# Altium footprint library Reflow3D1411sep.PcbLib: 657 footprints (part 23 of 42)
Each footprint in its own frame and in the unit in brackets; x right, y up, seen from the top. Pads: shape width x height; smd on the part's side, far side on the other; paste and mask are expansions set on the pad; w line width, h text height; cw(c..) or ccw(c..) is an arc to the next point about the centre after c.
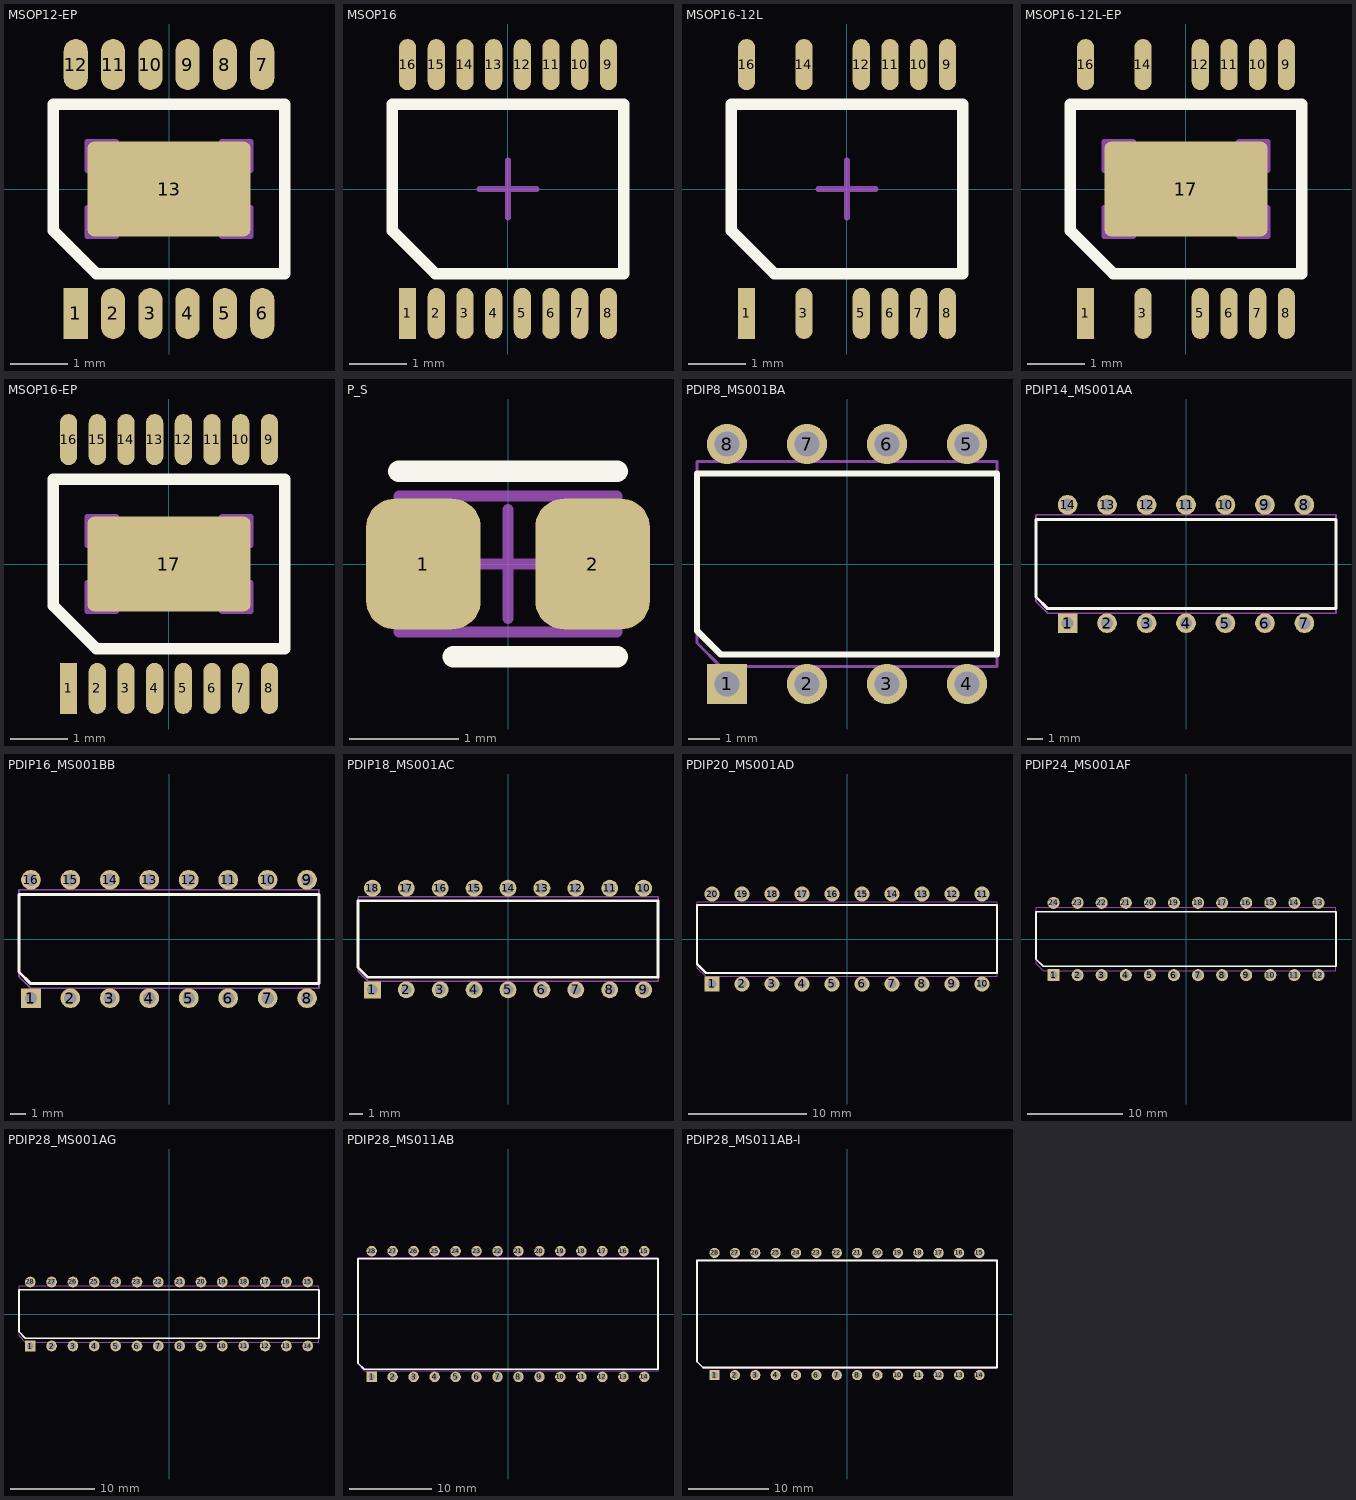
[diagram p22: the footprints below, top view; thin cyan lines are the x and y axes]

## MSOP12-EP [mm] "www.linear.com, MSE12.pdf"
height 0.96
pads (13):
  rect 0.42x0.89 smd mask+0.05: 1(-1.625,-2.17)
  oval 0.42x0.89 smd mask+0.05: 2(-0.975,-2.17) 3(-0.325,-2.17) 4(0.325,-2.17) 5(0.975,-2.17) 6(1.625,-2.17) 7(1.625,2.17) 8(0.975,2.17) 9(0.325,2.17) 10(-0.325,2.17) 11(-0.975,2.17) 12(-1.625,2.17)
  rrect15% 2.85x1.65 smd mask+0.075: 13(0,0)
Top Overlay:
  lines w0.2: -2.02,-0.725 -2.02,1.475 2.02,1.475 2.02,-1.475 -1.27,-1.475 -2.02,-0.725
Mechanical 13:
  lines w0.1: -1.425,-0.325 -1.425,-0.825 -0.925,-0.825 ; -1.425,0.325 -1.425,0.825 -0.925,0.825 ; 0.925,-0.825 1.425,-0.825 1.425,-0.325 ; 0.925,0.825 1.425,0.825 1.425,0.325 ; -2.02,-0.75 -2.02,1.5 2.02,1.5 2.02,-1.5 -1.27,-1.5 -2.02,-0.75
Mechanical 15:
  lines w0.1: -0.5,0 0.5,0 ; 0,-0.5 0,0.5
3D body: height 1.1, standoff 0, extent -2.07,-1.55 2.07,1.55

## MSOP16 [mm] "www.linear.com, MSOP_16_05-08-1669.pdf"
height 0.96
pads (16):
  rect 0.3x0.89 smd mask+0.05: 1(-1.75,-2.17)
  oval 0.3x0.89 smd mask+0.05: 2(-1.25,-2.17) 3(-0.75,-2.17) 4(-0.25,-2.17) 5(0.25,-2.17) 6(0.75,-2.17) 7(1.25,-2.17) 8(1.75,-2.17) 9(1.75,2.17) 10(1.25,2.17) 11(0.75,2.17) 12(0.25,2.17) 13(-0.25,2.17) 14(-0.75,2.17) 15(-1.25,2.17) 16(-1.75,2.17)
Top Overlay:
  lines w0.2: -2.02,-0.725 -2.02,1.475 2.02,1.475 2.02,-1.475 -1.27,-1.475 -2.02,-0.725
Mechanical 13:
  lines w0.1: -2.02,-0.75 -2.02,1.5 2.02,1.5 2.02,-1.5 -1.27,-1.5 -2.02,-0.75
Mechanical 15:
  lines w0.1: -0.5,0 0.5,0 ; 0,-0.5 0,0.5
3D body: height 1.1, standoff 0, extent -2.07,-1.55 2.07,1.55

## MSOP16-12L [mm] "www.linear.com, MSOP_16_12_05-08-1847.pdf"
height 0.96
pads (12):
  rect 0.3x0.89 smd mask+0.05: 1(-1.75,-2.17)
  oval 0.3x0.89 smd mask+0.05: 3(-0.75,-2.17) 5(0.25,-2.17) 6(0.75,-2.17) 7(1.25,-2.17) 8(1.75,-2.17) 9(1.75,2.17) 10(1.25,2.17) 11(0.75,2.17) 12(0.25,2.17) 14(-0.75,2.17) 16(-1.75,2.17)
Top Overlay:
  lines w0.2: -2.02,-0.725 -2.02,1.475 2.02,1.475 2.02,-1.475 -1.27,-1.475 -2.02,-0.725
Mechanical 13:
  lines w0.1: -2.02,-0.75 -2.02,1.5 2.02,1.5 2.02,-1.5 -1.27,-1.5 -2.02,-0.75
Mechanical 15:
  lines w0.1: -0.5,0 0.5,0 ; 0,-0.5 0,0.5
3D body: height 1.1, standoff 0, extent -2.07,-1.55 2.07,1.55

## MSOP16-12L-EP [mm] "www.linear.com, MSOP_16_05-08-1871.pdf"
height 0.96
pads (13):
  rect 0.3x0.89 smd mask+0.05: 1(-1.75,-2.17)
  oval 0.3x0.89 smd mask+0.05: 3(-0.75,-2.17) 5(0.25,-2.17) 6(0.75,-2.17) 7(1.25,-2.17) 8(1.75,-2.17) 9(1.75,2.17) 10(1.25,2.17) 11(0.75,2.17) 12(0.25,2.17) 14(-0.75,2.17) 16(-1.75,2.17)
  rrect15% 2.85x1.65 smd mask+0.075: 17(0,0)
Top Overlay:
  lines w0.2: -2.02,-0.725 -2.02,1.475 2.02,1.475 2.02,-1.475 -1.27,-1.475 -2.02,-0.725
Mechanical 13:
  lines w0.1: -1.425,-0.325 -1.425,-0.825 -0.925,-0.825 ; -1.425,0.325 -1.425,0.825 -0.925,0.825 ; 0.925,-0.825 1.425,-0.825 1.425,-0.325 ; 0.925,0.825 1.425,0.825 1.425,0.325 ; -2.02,-0.75 -2.02,1.5 2.02,1.5 2.02,-1.5 -1.27,-1.5 -2.02,-0.75
Mechanical 15:
  lines w0.1: -0.5,0 0.5,0 ; 0,-0.5 0,0.5
3D body: height 1.1, standoff 0, extent -2.07,-1.55 2.07,1.55

## MSOP16-EP [mm] "www.linear.com, MSOP_16_05-08-1667.pdf"
height 0.96
pads (17):
  rect 0.3x0.89 smd mask+0.05: 1(-1.75,-2.17)
  oval 0.3x0.89 smd mask+0.05: 2(-1.25,-2.17) 3(-0.75,-2.17) 4(-0.25,-2.17) 5(0.25,-2.17) 6(0.75,-2.17) 7(1.25,-2.17) 8(1.75,-2.17) 9(1.75,2.17) 10(1.25,2.17) 11(0.75,2.17) 12(0.25,2.17) 13(-0.25,2.17) 14(-0.75,2.17) 15(-1.25,2.17) 16(-1.75,2.17)
  rrect15% 2.85x1.65 smd mask+0.075: 17(0,0)
Top Overlay:
  lines w0.2: -2.02,-0.725 -2.02,1.475 2.02,1.475 2.02,-1.475 -1.27,-1.475 -2.02,-0.725
Mechanical 13:
  lines w0.1: -1.425,-0.325 -1.425,-0.825 -0.925,-0.825 ; -1.425,0.325 -1.425,0.825 -0.925,0.825 ; 0.925,-0.825 1.425,-0.825 1.425,-0.325 ; 0.925,0.825 1.425,0.825 1.425,0.325 ; -2.02,-0.75 -2.02,1.5 2.02,1.5 2.02,-1.5 -1.27,-1.5 -2.02,-0.75
Mechanical 15:
  lines w0.1: -0.5,0 0.5,0 ; 0,-0.5 0,0.5
3D body: height 1.1, standoff 0, extent -2.07,-1.55 2.07,1.55

## P_S [mm] "www.nec-tokin.com, capacitors.pdf; http://www.ncc-matsuo.co.jp, 278m.pdf"
height 1.1
pads (2):
  rrect50% 1.05x1.2 smd mask+0.075: 1(-0.775,0) 2(0.775,0)
Top Overlay:
  lines w0.2: -1,0.85 1,0.85 ; -0.5,-0.85 1,-0.85
Mechanical 13:
  lines w0.1: -0.5,-0.625 -0.5,0.625 ; -1,-0.625 1,-0.625 1,0.625 -1,0.625 -1,-0.625
Mechanical 15:
  lines w0.1: -0.5,0 0.5,0 ; 0,-0.5 0,0.5
3D body: height 1.2, standoff 0, extent -1.1,-0.725 1.1,0.725

## PCBComponent_1 [mm]

## PDIP8_MS001BA [mil] "www.ti.com, mpdi059.pdf, NTC8.asc"
height 150
pads (8):
  rect 50x50 hole 31: 1(-150,-150)
  round 50 hole 31: 2(-50,-150) 3(50,-150) 4(150,-150) 5(150,150) 6(50,150) 7(-50,150) 8(-150,150)
Top Overlay:
  lines w7.87: -187.6,-83.66 -187.6,113.19 187.6,113.19 187.6,-113.19 -158.07,-113.19 -187.6,-83.66
Mechanical 13:
  lines w3.94: -187.6,-98.82 -187.6,128.35 187.6,128.35 187.6,-128.35 -158.07,-128.35 -187.6,-98.82
3D body: height 164.96, standoff 0, extent -195.08,-137.6 195.08,137.6

## PDIP14_MS001AA [mil] "www.ti.com, mpdi002c.pdf, N14.asc"
height 167.72
pads (14):
  rect 50x50 hole 31: 1(-300,-150)
  round 50 hole 31: 2(-200,-150) 3(-100,-150) 4(0,-150) 5(100,-150) 6(200,-150) 7(300,-150) 8(300,150) 9(200,150) 10(100,150) 11(0,150) 12(-100,150) 13(-200,150) 14(-300,150)
Top Overlay:
  lines w7.87: -380.12,-83.66 -350.59,-113.19 380.12,-113.19 380.12,113.19 -380.12,113.19 -380.12,-83.66
Mechanical 13:
  lines w3.94: -380.12,-95.47 -350.59,-125 380.12,-125 380.12,125 -380.12,125 -380.12,-95.47
3D body: height 200, standoff 0, extent -387.6,-129.92 387.6,129.92

## PDIP16_MS001BB [mil] "www.ti.com, mpdi002c.pdf, N16.asc"
height 167.72
pads (16):
  rect 50x50 hole 31: 1(-350,-150)
  round 50 hole 31: 2(-250,-150) 3(-150,-150) 4(-50,-150) 5(50,-150) 6(150,-150) 7(250,-150) 8(350,-150) 9(350,150) 10(250,150) 11(150,150) 12(50,150) 13(-50,150) 14(-150,150) 15(-250,150) 16(-350,150)
Top Overlay:
  lines w7.87: -380.12,-83.66 -350.59,-113.19 380.12,-113.19 380.12,113.19 -380.12,113.19 -380.12,-83.66
Mechanical 13:
  lines w3.94: -380.12,-95.47 -350.59,-125 380.12,-125 380.12,125 -380.12,125 -380.12,-95.47
3D body: height 200, standoff 0, extent -387.6,-129.92 387.6,129.92

## PDIP18_MS001AC [mil] "www.ti.com, mpdi002c.pdf, N18.asc"
height 167.72
pads (18):
  rect 50x50 hole 31: 1(-400,-150)
  round 50 hole 31: 2(-300,-150) 3(-200,-150) 4(-100,-150) 5(0,-150) 6(100,-150) 7(200,-150) 8(300,-150) 9(400,-150) 10(400,150) 11(300,150) 12(200,150) 13(100,150) 14(0,150) 15(-100,150) 16(-200,150) 17(-300,150) 18(-400,150)
Top Overlay:
  lines w7.87: -442.52,-83.66 -412.99,-113.19 442.52,-113.19 442.52,113.19 -442.52,113.19 -442.52,-83.66
Mechanical 13:
  lines w3.94: -442.52,-95.47 -412.99,-125 442.52,-125 442.52,125 -442.52,125 -442.52,-95.47
3D body: height 200, standoff 0, extent -460.04,-129.92 460.04,129.92

## PDIP20_MS001AD [mil] "www.ti.com, mpdi002c.pdf, N20.asc"
height 167.72
pads (20):
  rect 50x50 hole 31: 1(-450,-150)
  round 50 hole 31: 2(-350,-150) 3(-250,-150) 4(-150,-150) 5(-50,-150) 6(50,-150) 7(150,-150) 8(250,-150) 9(350,-150) 10(450,-150) 11(450,150) 12(350,150) 13(250,150) 14(150,150) 15(50,150) 16(-50,150) 17(-150,150) 18(-250,150) 19(-350,150) 20(-450,150)
Top Overlay:
  lines w7.87: -500,-83.66 -470.47,-113.19 500,-113.19 500,113.19 -500,113.19 -500,-83.66
Mechanical 13:
  lines w3.94: -500,-95.47 -470.47,-125 500,-125 500,125 -500,125 -500,-95.47
3D body: height 200, standoff 0, extent -529.92,-129.92 529.92,129.92

## PDIP24_MS001AF [mil] "www.ti.com, mpdi004a.pdf, NT24.asc"
height 167.72
pads (24):
  rect 50x50 hole 31: 1(-550,-150)
  round 50 hole 31: 2(-450,-150) 3(-350,-150) 4(-250,-150) 5(-150,-150) 6(-50,-150) 7(50,-150) 8(150,-150) 9(250,-150) 10(350,-150) 11(450,-150) 12(550,-150) 13(550,150) 14(450,150) 15(350,150) 16(250,150) 17(150,150) 18(50,150) 19(-50,150) 20(-150,150) 21(-250,150) 22(-350,150) 23(-450,150) 24(-550,150)
Top Overlay:
  lines w7.87: -622.83,-83.66 -593.31,-113.19 622.83,-113.19 622.83,113.19 -622.83,113.19 -622.83,-83.66
Mechanical 13:
  lines w3.94: -622.83,-102.95 -593.31,-132.48 622.83,-132.48 622.83,132.48 -622.83,132.48 -622.83,-102.95
3D body: height 200, standoff 0, extent -630.71,-139.96 630.71,139.96

## PDIP28_MS001AG [mil] "www.ti.com, mpdi004a.pdf, NT28.asc"
height 167.72
pads (28):
  rect 50x50 hole 31: 1(-650,-150)
  round 50 hole 31: 2(-550,-150) 3(-450,-150) 4(-350,-150) 5(-250,-150) 6(-150,-150) 7(-50,-150) 8(50,-150) 9(150,-150) 10(250,-150) 11(350,-150) 12(450,-150) 13(550,-150) 14(650,-150) 15(650,150) 16(550,150) 17(450,150) 18(350,150) 19(250,150) 20(150,150) 21(50,150) 22(-50,150) 23(-150,150) 24(-250,150) 25(-350,150) 26(-450,150) 27(-550,150) 28(-650,150)
Top Overlay:
  lines w7.87: -702.56,-83.66 -702.56,113.19 702.56,113.19 702.56,-113.19 -673.03,-113.19 -702.56,-83.66
Mechanical 13:
  lines w3.94: -702.56,-102.95 -702.56,132.48 702.56,132.48 702.56,-132.48 -673.03,-132.48 -702.56,-102.95
3D body: height 200, standoff 0, extent -712.6,-139.96 712.6,139.96

## PDIP28_MS011AB [mil] "www.ti.com, mpdi008.pdf, N28.asc"
height 172.44
pads (28):
  rect 50x50 hole 31: 1(-650,-300)
  round 50 hole 31: 2(-550,-300) 3(-450,-300) 4(-350,-300) 5(-250,-300) 6(-150,-300) 7(-50,-300) 8(50,-300) 9(150,-300) 10(250,-300) 11(350,-300) 12(450,-300) 13(550,-300) 14(650,-300) 15(650,300) 16(550,300) 17(450,300) 18(350,300) 19(250,300) 20(150,300) 21(50,300) 22(-50,300) 23(-150,300) 24(-250,300) 25(-350,300) 26(-450,300) 27(-550,300) 28(-650,300)
Top Overlay:
  lines w7.87: -714.96,-233.27 -714.96,262.8 714.96,262.8 714.96,-262.8 -685.43,-262.8 -714.96,-233.27
Mechanical 13:
  lines w3.94: -714.96,-240.55 -714.96,270.08 714.96,270.08 714.96,-270.08 -685.43,-270.08 -714.96,-240.55
3D body: height 200, standoff 0, extent -725,-279.92 725,279.92

## PDIP28_MS011AB-I [mil] "www.ti.com, mpdi056.pdf, NTD28.asc; www.jedec.org, Ms-011b.pdf"
height 194.88
pads (28):
  rect 50x50 hole 31: 1(-650,-300)
  round 50 hole 31: 2(-550,-300) 3(-450,-300) 4(-350,-300) 5(-250,-300) 6(-150,-300) 7(-50,-300) 8(50,-300) 9(150,-300) 10(250,-300) 11(350,-300) 12(450,-300) 13(550,-300) 14(650,-300) 15(650,300) 16(550,300) 17(450,300) 18(350,300) 19(250,300) 20(150,300) 21(50,300) 22(-50,300) 23(-150,300) 24(-250,300) 25(-350,300) 26(-450,300) 27(-550,300) 28(-650,300)
Top Overlay:
  lines w7.87: -736.22,-233.27 -736.22,262.8 736.22,262.8 736.22,-262.8 -706.69,-262.8 -736.22,-233.27
Mechanical 13:
  lines w3.94: -736.22,-236.81 -736.22,266.34 736.22,266.34 736.22,-266.34 -706.69,-266.34 -736.22,-236.81
3D body: height 250, standoff 0, extent -782.48,-289.96 782.48,289.96